# Altium integrated library Altium_WCAP-AI3H (rev22a).IntLib: 37 symbols
Pins are listed as number, name and electrical type; pins without a type are passive.

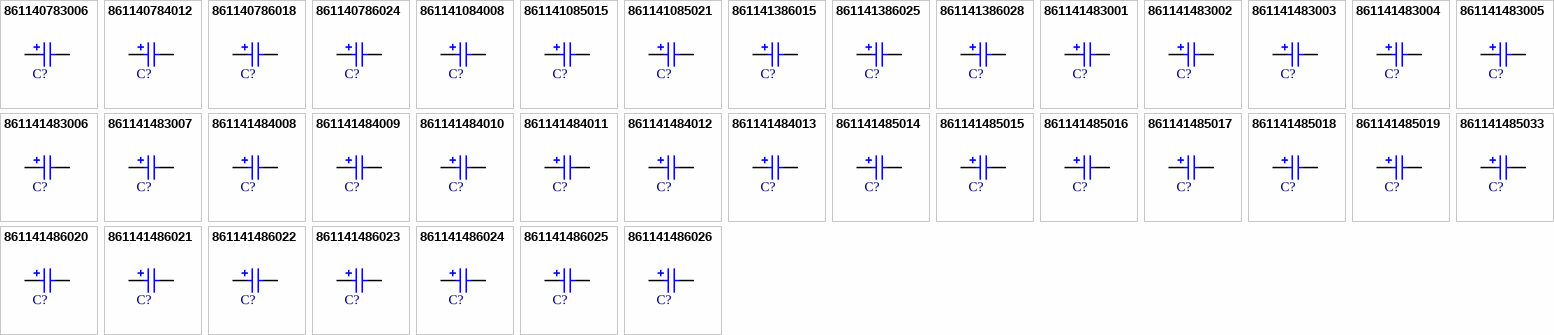
[diagram p0: symbols 861140783006 to 861141486026]

## 861140783006
designator C?, comment 2200uF  (value not drawn)
WCAP-AI3H Aluminum Electrolytic Capacitor, Snap-In, D22xH35mm, 2200uF, 63V; Manufacturer: Wurth Elektronik; Manufacturer Part Number: 861140783006; Capacitance Tolerance: +/-20%; Dissipation Factor: 20%; Endurance: 3000h; Leakage Current: 1116.87uA; Ripple Current: 1820mA; Technical Reference: ANDN350222M063DSIC3C000; ComponentLink1Description: Manufacturer Link; ComponentLink1URL: https://www.we-online.com/redexpert/article/861140783006?ad; ComponentLink2Description: Datasheet; ComponentLink2URL: https://www.we-online.com/redexpert/spec/861140783006?ad; Category: Aluminum Electrolytic Capacitors; Match Code: WCAP-AI3H; Mount: Through Hole; Operating Temperature Max: 105°C; Operating Temperature Min: -40°C; Packaging: Tray; Height: 35mm; Diameter: 22mm; Capacitance: 2200uF; Rated Voltage (DC): 63V
footprint WCAP-AI3H_D22H35
pins: 1 P, 2 N

## 861140784012
designator C?, comment 3300uF  (value not drawn)
WCAP-AI3H Aluminum Electrolytic Capacitor, Snap-In, D25xH35mm, 3300uF, 63V; Manufacturer: Wurth Elektronik; Manufacturer Part Number: 861140784012; Capacitance Tolerance: +/-20%; Dissipation Factor: 20%; Endurance: 3000h; Leakage Current: 1367.88uA; Ripple Current: 2270mA; Technical Reference: ANDO350332M063DSIC3C000; ComponentLink1Description: Manufacturer Link; ComponentLink1URL: https://www.we-online.com/redexpert/article/861140784012?ad; ComponentLink2Description: Datasheet; ComponentLink2URL: https://www.we-online.com/redexpert/spec/861140784012?ad; Category: Aluminum Electrolytic Capacitors; Match Code: WCAP-AI3H; Mount: Through Hole; Operating Temperature Max: 105°C; Operating Temperature Min: -40°C; Packaging: Tray; Height: 35mm; Diameter: 25mm; Capacitance: 3300uF; Rated Voltage (DC): 63V
footprint WCAP-AI3H_D25H35
pins: 1 P, 2 N

## 861140786018
designator C?, comment 4700uF  (value not drawn)
WCAP-AI3H Aluminum Electrolytic Capacitor, Snap-In, D35xH30mm, 4700uF, 63V; Manufacturer: Wurth Elektronik; Manufacturer Part Number: 861140786018; Capacitance Tolerance: +/-20%; Dissipation Factor: 30%; Endurance: 3000h; Leakage Current: 1632.45uA; Ripple Current: 2830mA; Technical Reference: ANDQ300472M063DSIC2C000; ComponentLink1Description: Manufacturer Link; ComponentLink1URL: https://www.we-online.com/redexpert/article/861140786018?ad; ComponentLink2Description: Datasheet; ComponentLink2URL: https://www.we-online.com/redexpert/spec/861140786018?ad; Category: Aluminum Electrolytic Capacitors; Match Code: WCAP-AI3H; Mount: Through Hole; Operating Temperature Max: 105°C; Operating Temperature Min: -40°C; Packaging: Tray; Height: 30mm; Diameter: 35mm; Capacitance: 4700uF; Rated Voltage (DC): 63V
footprint WCAP-AI3H_D35H30
pins: 1 P, 2 N

## 861140786024
designator C?, comment 10000uF  (value not drawn)
WCAP-AI3H Aluminum Electrolytic Capacitor, Snap-In, D35xH52mm, 10000uF, 63V; Manufacturer: Wurth Elektronik; Manufacturer Part Number: 861140786024; Capacitance Tolerance: +/-20%; Dissipation Factor: 30%; Endurance: 3000h; Leakage Current: 2381.18uA; Ripple Current: 4690mA; Technical Reference: ANDQ520103M063DSIC2C000; ComponentLink1Description: Manufacturer Link; ComponentLink1URL: https://www.we-online.com/redexpert/article/861140786024?ad; ComponentLink2Description: Datasheet; ComponentLink2URL: https://www.we-online.com/redexpert/spec/861140786024?ad; Category: Aluminum Electrolytic Capacitors; Match Code: WCAP-AI3H; Mount: Through Hole; Operating Temperature Max: 105°C; Operating Temperature Min: -40°C; Packaging: Tray; Height: 52mm; Diameter: 35mm; Capacitance: 10000uF; Rated Voltage (DC): 63V
footprint WCAP-AI3H_D35H52
pins: 1 P, 2 N

## 861141084008
designator C?, comment 470uF  (value not drawn)
WCAP-AI3H Aluminum Electrolytic Capacitor, Snap-In, D25xH30mm, 470uF, 200V; Manufacturer: Wurth Elektronik; Manufacturer Part Number: 861141084008; Capacitance Tolerance: +/-20%; Dissipation Factor: 15%; Endurance: 3000h; Leakage Current: 919.78uA; Ripple Current: 1500mA; Technical Reference: ANDO300471M200DSIC3C004; ComponentLink1Description: Manufacturer Link; ComponentLink1URL: https://www.we-online.com/redexpert/article/861141084008?ad; ComponentLink2Description: Datasheet; ComponentLink2URL: https://www.we-online.com/redexpert/spec/861141084008?ad; Category: Aluminum Electrolytic Capacitors; Match Code: WCAP-AI3H; Mount: Through Hole; Operating Temperature Max: 105°C; Operating Temperature Min: -25°C; Packaging: Tray; Height: 30mm; Diameter: 25mm; Capacitance: 470uF; Rated Voltage (DC): 200V
footprint WCAP-AI3H_D25H30
pins: 1 P, 2 N

## 861141085015
designator C?, comment 680uF  (value not drawn)
WCAP-AI3H Aluminum Electrolytic Capacitor, Snap-In, D30xH30mm, 680uF, 200V; Manufacturer: Wurth Elektronik; Manufacturer Part Number: 861141085015; Capacitance Tolerance: +/-20%; Dissipation Factor: 15%; Endurance: 3000h; Leakage Current: 1106.35uA; Ripple Current: 1780mA; Technical Reference: ANJP300681M200DSIC2C000; ComponentLink1Description: Manufacturer Link; ComponentLink1URL: https://www.we-online.com/redexpert/article/861141085015?ad; ComponentLink2Description: Datasheet; ComponentLink2URL: https://www.we-online.com/redexpert/spec/861141085015?ad; Category: Aluminum Electrolytic Capacitors; Match Code: WCAP-AI3H; Mount: Through Hole; Operating Temperature Max: 105°C; Operating Temperature Min: -25°C; Packaging: Tray; Height: 30mm; Diameter: 30mm; Capacitance: 680uF; Rated Voltage (DC): 200V
footprint WCAP-AI3H_D30H30
pins: 1 P, 2 N

## 861141085021
designator C?, comment 1000uF  (value not drawn)
WCAP-AI3H Aluminum Electrolytic Capacitor, Snap-In, D30xH35mm, 1000uF, 200V; Manufacturer: Wurth Elektronik; Manufacturer Part Number: 861141085021; Capacitance Tolerance: +/-20%; Dissipation Factor: 15%; Endurance: 3000h; Leakage Current: 1341.64uA; Ripple Current: 2300mA; Technical Reference: ANJP350102M200DSIC2C000; ComponentLink1Description: Manufacturer Link; ComponentLink1URL: https://www.we-online.com/redexpert/article/861141085021?ad; ComponentLink2Description: Datasheet; ComponentLink2URL: https://www.we-online.com/redexpert/spec/861141085021?ad; Category: Aluminum Electrolytic Capacitors; Match Code: WCAP-AI3H; Mount: Through Hole; Operating Temperature Max: 105°C; Operating Temperature Min: -25°C; Packaging: Tray; Height: 35mm; Diameter: 30mm; Capacitance: 1000uF; Rated Voltage (DC): 200V
footprint WCAP-AI3H_D30H35
pins: 1 P, 2 N

## 861141386015
designator C?, comment 220uF  (value not drawn)
WCAP-AI3H Aluminum Electrolytic Capacitor, Snap-In, D35xH25mm, 220uF, 400V; Manufacturer: Wurth Elektronik; Manufacturer Part Number: 861141386015; Capacitance Tolerance: +/-20%; Dissipation Factor: 20%; Endurance: 3000h; Leakage Current: 889.94uA; Ripple Current: 1100mA; Technical Reference: ANJQ250221M400DSIC2C000; ComponentLink1Description: Manufacturer Link; ComponentLink1URL: https://www.we-online.com/redexpert/article/861141386015?ad; ComponentLink2Description: Datasheet; ComponentLink2URL: https://www.we-online.com/redexpert/spec/861141386015?ad; Category: Aluminum Electrolytic Capacitors; Match Code: WCAP-AI3H; Mount: Through Hole; Operating Temperature Max: 105°C; Operating Temperature Min: -25°C; Packaging: Tray; Height: 25mm; Diameter: 35mm; Capacitance: 220uF; Rated Voltage (DC): 400V
footprint WCAP-AI3H_D35H25
pins: 1 P, 2 N

## 861141386025
designator C?, comment 470uF  (value not drawn)
WCAP-AI3H Aluminum Electrolytic Capacitor, Snap-In, D35xH40mm, 470uF, 400V; Manufacturer: Wurth Elektronik; Manufacturer Part Number: 861141386025; Capacitance Tolerance: +/-20%; Dissipation Factor: 20%; Endurance: 3000h; Leakage Current: 1300.77uA; Ripple Current: 1900mA; Technical Reference: ANJQ400471M400DSIC2C000; ComponentLink1Description: Manufacturer Link; ComponentLink1URL: https://www.we-online.com/redexpert/article/861141386025?ad; ComponentLink2Description: Datasheet; ComponentLink2URL: https://www.we-online.com/redexpert/spec/861141386025?ad; Category: Aluminum Electrolytic Capacitors; Match Code: WCAP-AI3H; Mount: Through Hole; Operating Temperature Max: 105°C; Operating Temperature Min: -25°C; Packaging: Tray; Height: 40mm; Diameter: 35mm; Capacitance: 470uF; Rated Voltage (DC): 400V
footprint WCAP-AI3H_D35H40
pins: 1 P, 2 N

## 861141386028
designator C?, comment 1000uF  (value not drawn)
WCAP-AI3H Aluminum Electrolytic Capacitor, Snap-In, D35xH65mm, 1000uF, 400V; Manufacturer: Wurth Elektronik; Manufacturer Part Number: 861141386028; Capacitance Tolerance: +/-20%; Dissipation Factor: 20%; Endurance: 3000h; Leakage Current: 1897.37uA; Ripple Current: 2650mA; Technical Reference: ANJQ650102M400DSIC2C000; ComponentLink1Description: Manufacturer Link; ComponentLink1URL: https://www.we-online.com/redexpert/article/861141386028?ad; ComponentLink2Description: Datasheet; ComponentLink2URL: https://www.we-online.com/redexpert/spec/861141386028?ad; Category: Aluminum Electrolytic Capacitors; Match Code: WCAP-AI3H; Mount: Through Hole; Operating Temperature Max: 105°C; Operating Temperature Min: -25°C; Packaging: Tray; Height: 65mm; Diameter: 35mm; Capacitance: 1000uF; Rated Voltage (DC): 400V
footprint WCAP-AI3H_D35H65
pins: 1 P, 2 N

## 861141483001
designator C?, comment 68uF  (value not drawn)
WCAP-AI3H Aluminum Electrolytic Capacitor, Snap-In, D22xH25mm, 68uF, 450V; Manufacturer: Wurth Elektronik; Manufacturer Part Number: 861141483001; Capacitance Tolerance: +/-20%; Dissipation Factor: 20%; Endurance: 3000h; Leakage Current: 524.79uA; Ripple Current: 520mA; Technical Reference: ANJN250680M450DSIC3C000; ComponentLink1Description: Manufacturer Link; ComponentLink1URL: https://www.we-online.com/redexpert/article/861141483001?ad; ComponentLink2Description: Datasheet; ComponentLink2URL: https://www.we-online.com/redexpert/spec/861141483001?ad; Category: Aluminum Electrolytic Capacitors; Match Code: WCAP-AI3H; Mount: Through Hole; Operating Temperature Max: 105°C; Operating Temperature Min: -25°C; Packaging: Tray; Height: 25mm; Diameter: 22mm; Capacitance: 68uF; Rated Voltage (DC): 450V
footprint WCAP-AI3H_D22H25
pins: 1 P, 2 N

## 861141483002
designator C?, comment 82uF  (value not drawn)
WCAP-AI3H Aluminum Electrolytic Capacitor, Snap-In, D22xH30mm, 82uF, 450V; Manufacturer: Wurth Elektronik; Manufacturer Part Number: 861141483002; Capacitance Tolerance: +/-20%; Dissipation Factor: 20%; Endurance: 3000h; Leakage Current: 576.28uA; Ripple Current: 640mA; Technical Reference: ANJN300820M450DSIC3C000; ComponentLink1Description: Manufacturer Link; ComponentLink1URL: https://www.we-online.com/redexpert/article/861141483002?ad; ComponentLink2Description: Datasheet; ComponentLink2URL: https://www.we-online.com/redexpert/spec/861141483002?ad; Category: Aluminum Electrolytic Capacitors; Match Code: WCAP-AI3H; Mount: Through Hole; Operating Temperature Max: 105°C; Operating Temperature Min: -25°C; Packaging: Tray; Height: 30mm; Diameter: 22mm; Capacitance: 82uF; Rated Voltage (DC): 450V
footprint WCAP-AI3H_D22H30
pins: 1 P, 2 N

## 861141483003
designator C?, comment 100uF  (value not drawn)
WCAP-AI3H Aluminum Electrolytic Capacitor, Snap-In, D22xH35mm, 100uF, 450V; Manufacturer: Wurth Elektronik; Manufacturer Part Number: 861141483003; Capacitance Tolerance: +/-20%; Dissipation Factor: 20%; Endurance: 3000h; Leakage Current: 636.4uA; Ripple Current: 690mA; Technical Reference: ANJN350101M450DSIC3C000; ComponentLink1Description: Manufacturer Link; ComponentLink1URL: https://www.we-online.com/redexpert/article/861141483003?ad; ComponentLink2Description: Datasheet; ComponentLink2URL: https://www.we-online.com/redexpert/spec/861141483003?ad; Category: Aluminum Electrolytic Capacitors; Match Code: WCAP-AI3H; Mount: Through Hole; Operating Temperature Max: 105°C; Operating Temperature Min: -25°C; Packaging: Tray; Height: 35mm; Diameter: 22mm; Capacitance: 100uF; Rated Voltage (DC): 450V
footprint WCAP-AI3H_D22H35
pins: 1 P, 2 N

## 861141483004
designator C?, comment 120uF  (value not drawn)
WCAP-AI3H Aluminum Electrolytic Capacitor, Snap-In, D22xH40mm, 120uF, 450V; Manufacturer: Wurth Elektronik; Manufacturer Part Number: 861141483004; Capacitance Tolerance: +/-20%; Dissipation Factor: 20%; Endurance: 3000h; Leakage Current: 697.14uA; Ripple Current: 800mA; Technical Reference: ANJN400121M450DSIC3C000; ComponentLink1Description: Manufacturer Link; ComponentLink1URL: https://www.we-online.com/redexpert/article/861141483004?ad; ComponentLink2Description: Datasheet; ComponentLink2URL: https://www.we-online.com/redexpert/spec/861141483004?ad; Category: Aluminum Electrolytic Capacitors; Match Code: WCAP-AI3H; Mount: Through Hole; Operating Temperature Max: 105°C; Operating Temperature Min: -25°C; Packaging: Tray; Height: 40mm; Diameter: 22mm; Capacitance: 120uF; Rated Voltage (DC): 450V
footprint WCAP-AI3H_D22H40
pins: 1 P, 2 N

## 861141483005
designator C?, comment 150uF  (value not drawn)
WCAP-AI3H Aluminum Electrolytic Capacitor, Snap-In, D22xH45mm, 150uF, 450V; Manufacturer: Wurth Elektronik; Manufacturer Part Number: 861141483005; Capacitance Tolerance: +/-20%; Dissipation Factor: 20%; Endurance: 3000h; Leakage Current: 779.42uA; Ripple Current: 880mA; Technical Reference: ANJN450151M450DSIC3C000; ComponentLink1Description: Manufacturer Link; ComponentLink1URL: https://www.we-online.com/redexpert/article/861141483005?ad; ComponentLink2Description: Datasheet; ComponentLink2URL: https://www.we-online.com/redexpert/spec/861141483005?ad; Category: Aluminum Electrolytic Capacitors; Match Code: WCAP-AI3H; Mount: Through Hole; Operating Temperature Max: 105°C; Operating Temperature Min: -25°C; Packaging: Tray; Height: 45mm; Diameter: 22mm; Capacitance: 150uF; Rated Voltage (DC): 450V
footprint WCAP-AI3H_D22H45
pins: 1 P, 2 N

## 861141483006
designator C?, comment 180uF  (value not drawn)
WCAP-AI3H Aluminum Electrolytic Capacitor, Snap-In, D22xH50mm, 180uF, 450V; Manufacturer: Wurth Elektronik; Manufacturer Part Number: 861141483006; Capacitance Tolerance: +/-20%; Dissipation Factor: 20%; Endurance: 3000h; Leakage Current: 853.81uA; Ripple Current: 1000mA; Technical Reference: ANJN500181M450DSIC3C000; ComponentLink1Description: Manufacturer Link; ComponentLink1URL: https://www.we-online.com/redexpert/article/861141483006?ad; ComponentLink2Description: Datasheet; ComponentLink2URL: https://www.we-online.com/redexpert/spec/861141483006?ad; Category: Aluminum Electrolytic Capacitors; Match Code: WCAP-AI3H; Mount: Through Hole; Operating Temperature Max: 105°C; Operating Temperature Min: -25°C; Packaging: Tray; Height: 50mm; Diameter: 22mm; Capacitance: 180uF; Rated Voltage (DC): 450V
footprint WCAP-AI3H_D22H50
pins: 1 P, 2 N

## 861141483007
designator C?, comment 220uF  (value not drawn)
WCAP-AI3H Aluminum Electrolytic Capacitor, Snap-In, D22xH50mm, 220uF, 450V; Manufacturer: Wurth Elektronik; Manufacturer Part Number: 861141483007; Capacitance Tolerance: +/-20%; Dissipation Factor: 20%; Endurance: 3000h; Leakage Current: 943.93uA; Ripple Current: 1000mA; Technical Reference: ANJN500221M450DSIC3C000; ComponentLink1Description: Manufacturer Link; ComponentLink1URL: https://www.we-online.com/redexpert/article/861141483007?ad; ComponentLink2Description: Datasheet; ComponentLink2URL: https://www.we-online.com/redexpert/spec/861141483007?ad; Category: Aluminum Electrolytic Capacitors; Match Code: WCAP-AI3H; Mount: Through Hole; Operating Temperature Max: 105°C; Operating Temperature Min: -25°C; Packaging: Tray; Height: 50mm; Diameter: 22mm; Capacitance: 220uF; Rated Voltage (DC): 450V
footprint WCAP-AI3H_D22H50
pins: 1 P, 2 N

## 861141484008
designator C?, comment 82uF  (value not drawn)
WCAP-AI3H Aluminum Electrolytic Capacitor, Snap-In, D25xH25mm, 82uF, 450V; Manufacturer: Wurth Elektronik; Manufacturer Part Number: 861141484008; Capacitance Tolerance: +/-20%; Dissipation Factor: 20%; Endurance: 3000h; Leakage Current: 576.28uA; Ripple Current: 640mA; Technical Reference: ANJO250820M450DSIC3C000; ComponentLink1Description: Manufacturer Link; ComponentLink1URL: https://www.we-online.com/redexpert/article/861141484008?ad; ComponentLink2Description: Datasheet; ComponentLink2URL: https://www.we-online.com/redexpert/spec/861141484008?ad; Category: Aluminum Electrolytic Capacitors; Match Code: WCAP-AI3H; Mount: Through Hole; Operating Temperature Max: 105°C; Operating Temperature Min: -25°C; Packaging: Tray; Height: 25mm; Diameter: 25mm; Capacitance: 82uF; Rated Voltage (DC): 450V
footprint WCAP-AI3H_D25H25
pins: 1 P, 2 N

## 861141484009
designator C?, comment 100uF  (value not drawn)
WCAP-AI3H Aluminum Electrolytic Capacitor, Snap-In, D25xH30mm, 100uF, 450V; Manufacturer: Wurth Elektronik; Manufacturer Part Number: 861141484009; Capacitance Tolerance: +/-20%; Dissipation Factor: 20%; Endurance: 3000h; Leakage Current: 636.4uA; Ripple Current: 690mA; Technical Reference: ANJO300101M450DSIC3C000; ComponentLink1Description: Manufacturer Link; ComponentLink1URL: https://www.we-online.com/redexpert/article/861141484009?ad; ComponentLink2Description: Datasheet; ComponentLink2URL: https://www.we-online.com/redexpert/spec/861141484009?ad; Category: Aluminum Electrolytic Capacitors; Match Code: WCAP-AI3H; Mount: Through Hole; Operating Temperature Max: 105°C; Operating Temperature Min: -25°C; Packaging: Tray; Height: 30mm; Diameter: 25mm; Capacitance: 100uF; Rated Voltage (DC): 450V
footprint WCAP-AI3H_D25H30
pins: 1 P, 2 N

## 861141484010
designator C?, comment 120uF  (value not drawn)
WCAP-AI3H Aluminum Electrolytic Capacitor, Snap-In, D25xH30mm, 120uF, 450V; Manufacturer: Wurth Elektronik; Manufacturer Part Number: 861141484010; Capacitance Tolerance: +/-20%; Dissipation Factor: 20%; Endurance: 3000h; Leakage Current: 697.14uA; Ripple Current: 800mA; Technical Reference: ANJO300121M450DSIC3C000; ComponentLink1Description: Manufacturer Link; ComponentLink1URL: https://www.we-online.com/redexpert/article/861141484010?ad; ComponentLink2Description: Datasheet; ComponentLink2URL: https://www.we-online.com/redexpert/spec/861141484010?ad; Category: Aluminum Electrolytic Capacitors; Match Code: WCAP-AI3H; Mount: Through Hole; Operating Temperature Max: 105°C; Operating Temperature Min: -25°C; Packaging: Tray; Height: 30mm; Diameter: 25mm; Capacitance: 120uF; Rated Voltage (DC): 450V
footprint WCAP-AI3H_D25H30
pins: 1 P, 2 N

## 861141484011
designator C?, comment 150uF  (value not drawn)
WCAP-AI3H Aluminum Electrolytic Capacitor, Snap-In, D25xH35mm, 150uF, 450V; Manufacturer: Wurth Elektronik; Manufacturer Part Number: 861141484011; Capacitance Tolerance: +/-20%; Dissipation Factor: 20%; Endurance: 3000h; Leakage Current: 779.42uA; Ripple Current: 880mA; Technical Reference: ANJO350151M450DSIC3C000; ComponentLink1Description: Manufacturer Link; ComponentLink1URL: https://www.we-online.com/redexpert/article/861141484011?ad; ComponentLink2Description: Datasheet; ComponentLink2URL: https://www.we-online.com/redexpert/spec/861141484011?ad; Category: Aluminum Electrolytic Capacitors; Match Code: WCAP-AI3H; Mount: Through Hole; Operating Temperature Max: 105°C; Operating Temperature Min: -25°C; Packaging: Tray; Height: 35mm; Diameter: 25mm; Capacitance: 150uF; Rated Voltage (DC): 450V
footprint WCAP-AI3H_D25H35
pins: 1 P, 2 N

## 861141484012
designator C?, comment 180uF  (value not drawn)
WCAP-AI3H Aluminum Electrolytic Capacitor, Snap-In, D25xH40mm, 180uF, 450V; Manufacturer: Wurth Elektronik; Manufacturer Part Number: 861141484012; Capacitance Tolerance: +/-20%; Dissipation Factor: 20%; Endurance: 3000h; Leakage Current: 853.81uA; Ripple Current: 1000mA; Technical Reference: ANJO400181M450DSIC3C000; ComponentLink1Description: Manufacturer Link; ComponentLink1URL: https://www.we-online.com/redexpert/article/861141484012?ad; ComponentLink2Description: Datasheet; ComponentLink2URL: https://www.we-online.com/redexpert/spec/861141484012?ad; Category: Aluminum Electrolytic Capacitors; Match Code: WCAP-AI3H; Mount: Through Hole; Operating Temperature Max: 105°C; Operating Temperature Min: -25°C; Packaging: Tray; Height: 40mm; Diameter: 25mm; Capacitance: 180uF; Rated Voltage (DC): 450V
footprint WCAP-AI3H_D25H40
pins: 1 P, 2 N

## 861141484013
designator C?, comment 220uF  (value not drawn)
WCAP-AI3H Aluminum Electrolytic Capacitor, Snap-In, D25xH45mm, 220uF, 450V; Manufacturer: Wurth Elektronik; Manufacturer Part Number: 861141484013; Capacitance Tolerance: +/-20%; Dissipation Factor: 20%; Endurance: 3000h; Leakage Current: 943.93uA; Ripple Current: 1120mA; Technical Reference: ANJO450221M450DSIC3C000; ComponentLink1Description: Manufacturer Link; ComponentLink1URL: https://www.we-online.com/redexpert/article/861141484013?ad; ComponentLink2Description: Datasheet; ComponentLink2URL: https://www.we-online.com/redexpert/spec/861141484013?ad; Category: Aluminum Electrolytic Capacitors; Match Code: WCAP-AI3H; Mount: Through Hole; Operating Temperature Max: 105°C; Operating Temperature Min: -25°C; Packaging: Tray; Height: 45mm; Diameter: 25mm; Capacitance: 220uF; Rated Voltage (DC): 450V
footprint WCAP-AI3H_D25H45
pins: 1 P, 2 N

## 861141485014
designator C?, comment 120uF  (value not drawn)
WCAP-AI3H Aluminum Electrolytic Capacitor, Snap-In, D30xH25mm, 120uF, 450V; Manufacturer: Wurth Elektronik; Manufacturer Part Number: 861141485014; Capacitance Tolerance: +/-20%; Dissipation Factor: 20%; Endurance: 3000h; Leakage Current: 697.14uA; Ripple Current: 800mA; Technical Reference: ANJP250121M450DSIC2C000; ComponentLink1Description: Manufacturer Link; ComponentLink1URL: https://www.we-online.com/redexpert/article/861141485014?ad; ComponentLink2Description: Datasheet; ComponentLink2URL: https://www.we-online.com/redexpert/spec/861141485014?ad; Category: Aluminum Electrolytic Capacitors; Match Code: WCAP-AI3H; Mount: Through Hole; Operating Temperature Max: 105°C; Operating Temperature Min: -25°C; Packaging: Tray; Height: 25mm; Diameter: 30mm; Capacitance: 120uF; Rated Voltage (DC): 450V
footprint WCAP-AI3H_D30H25
pins: 1 P, 2 N

## 861141485015
designator C?, comment 150uF  (value not drawn)
WCAP-AI3H Aluminum Electrolytic Capacitor, Snap-In, D30xH30mm, 150uF, 450V; Manufacturer: Wurth Elektronik; Manufacturer Part Number: 861141485015; Capacitance Tolerance: +/-20%; Dissipation Factor: 20%; Endurance: 3000h; Leakage Current: 779.42uA; Ripple Current: 880mA; Technical Reference: ANJP300151M450DSIC2C000; ComponentLink1Description: Manufacturer Link; ComponentLink1URL: https://www.we-online.com/redexpert/article/861141485015?ad; ComponentLink2Description: Datasheet; ComponentLink2URL: https://www.we-online.com/redexpert/spec/861141485015?ad; Category: Aluminum Electrolytic Capacitors; Match Code: WCAP-AI3H; Mount: Through Hole; Operating Temperature Max: 105°C; Operating Temperature Min: -25°C; Packaging: Tray; Height: 30mm; Diameter: 30mm; Capacitance: 150uF; Rated Voltage (DC): 450V
footprint WCAP-AI3H_D30H30
pins: 1 P, 2 N

## 861141485016
designator C?, comment 180uF  (value not drawn)
WCAP-AI3H Aluminum Electrolytic Capacitor, Snap-In, D30xH30mm, 180uF, 450V; Manufacturer: Wurth Elektronik; Manufacturer Part Number: 861141485016; Capacitance Tolerance: +/-20%; Dissipation Factor: 20%; Endurance: 3000h; Leakage Current: 853.81uA; Ripple Current: 1000mA; Technical Reference: ANJP300181M450DSIC2C000; ComponentLink1Description: Manufacturer Link; ComponentLink1URL: https://www.we-online.com/redexpert/article/861141485016?ad; ComponentLink2Description: Datasheet; ComponentLink2URL: https://www.we-online.com/redexpert/spec/861141485016?ad; Category: Aluminum Electrolytic Capacitors; Match Code: WCAP-AI3H; Mount: Through Hole; Operating Temperature Max: 105°C; Operating Temperature Min: -25°C; Packaging: Tray; Height: 30mm; Diameter: 30mm; Capacitance: 180uF; Rated Voltage (DC): 450V
footprint WCAP-AI3H_D30H30
pins: 1 P, 2 N

## 861141485017
designator C?, comment 220uF  (value not drawn)
WCAP-AI3H Aluminum Electrolytic Capacitor, Snap-In, D30xH35mm, 220uF, 450V; Manufacturer: Wurth Elektronik; Manufacturer Part Number: 861141485017; Capacitance Tolerance: +/-20%; Dissipation Factor: 20%; Endurance: 3000h; Leakage Current: 943.93uA; Ripple Current: 1120mA; Technical Reference: ANJP350221M450DSIC2C000; ComponentLink1Description: Manufacturer Link; ComponentLink1URL: https://www.we-online.com/redexpert/article/861141485017?ad; ComponentLink2Description: Datasheet; ComponentLink2URL: https://www.we-online.com/redexpert/spec/861141485017?ad; Category: Aluminum Electrolytic Capacitors; Match Code: WCAP-AI3H; Mount: Through Hole; Operating Temperature Max: 105°C; Operating Temperature Min: -25°C; Packaging: Tray; Height: 35mm; Diameter: 30mm; Capacitance: 220uF; Rated Voltage (DC): 450V
footprint WCAP-AI3H_D30H35
pins: 1 P, 2 N

## 861141485018
designator C?, comment 270uF  (value not drawn)
WCAP-AI3H Aluminum Electrolytic Capacitor, Snap-In, D30xH40mm, 270uF, 450V; Manufacturer: Wurth Elektronik; Manufacturer Part Number: 861141485018; Capacitance Tolerance: +/-20%; Dissipation Factor: 20%; Endurance: 3000h; Leakage Current: 1045.71uA; Ripple Current: 1280mA; Technical Reference: ANJP400271M450DSIC2C000; ComponentLink1Description: Manufacturer Link; ComponentLink1URL: https://www.we-online.com/redexpert/article/861141485018?ad; ComponentLink2Description: Datasheet; ComponentLink2URL: https://www.we-online.com/redexpert/spec/861141485018?ad; Category: Aluminum Electrolytic Capacitors; Match Code: WCAP-AI3H; Mount: Through Hole; Operating Temperature Max: 105°C; Operating Temperature Min: -25°C; Packaging: Tray; Height: 40mm; Diameter: 30mm; Capacitance: 270uF; Rated Voltage (DC): 450V
footprint WCAP-AI3H_D30H40
pins: 1 P, 2 N

## 861141485019
designator C?, comment 330uF  (value not drawn)
WCAP-AI3H Aluminum Electrolytic Capacitor, Snap-In, D30xH50mm, 330uF, 450V; Manufacturer: Wurth Elektronik; Manufacturer Part Number: 861141485019; Capacitance Tolerance: +/-20%; Dissipation Factor: 20%; Endurance: 3000h; Leakage Current: 1156.07uA; Ripple Current: 1450mA; Technical Reference: ANJP500331M450DSIC2C000; ComponentLink1Description: Manufacturer Link; ComponentLink1URL: https://www.we-online.com/redexpert/article/861141485019?ad; ComponentLink2Description: Datasheet; ComponentLink2URL: https://www.we-online.com/redexpert/spec/861141485019?ad; Category: Aluminum Electrolytic Capacitors; Match Code: WCAP-AI3H; Mount: Through Hole; Operating Temperature Max: 105°C; Operating Temperature Min: -25°C; Packaging: Tray; Height: 50mm; Diameter: 30mm; Capacitance: 330uF; Rated Voltage (DC): 450V
footprint WCAP-AI3H_D30H50
pins: 1 P, 2 N

## 861141485033
designator C?, comment 470uF  (value not drawn)
WCAP-AI3H Aluminum Electrolytic Capacitor, Snap-In, D30xH40mm, 470uF, 450V; Manufacturer: Wurth Elektronik; Manufacturer Part Number: 861141485033; Capacitance Tolerance: +/-20%; Dissipation Factor: 20%; Endurance: 4000h; Leakage Current: 1380uA; Ripple Current: 1940mA; Technical Reference: ANDP400471M450DSIC2D0T2; ComponentLink1Description: Manufacturer Link; ComponentLink1URL: https://www.we-online.com/redexpert/article/861141485033?ad; ComponentLink2Description: Datasheet; ComponentLink2URL: https://www.we-online.com/redexpert/spec/861141485033?ad; Category: Aluminum Electrolytic Capacitors; Match Code: WCAP-AI3H; Mount: Through Hole; Operating Temperature Max: 105°C; Operating Temperature Min: -40°C; Packaging: Tray; Height: 40mm; Diameter: 30mm; Capacitance: 470uF; Rated Voltage (DC): 450V
footprint WCAP-AI3H_D30H40
pins: 1 P, 2 N

## 861141486020
designator C?, comment 220uF  (value not drawn)
WCAP-AI3H Aluminum Electrolytic Capacitor, Snap-In, D35xH30mm, 220uF, 450V; Manufacturer: Wurth Elektronik; Manufacturer Part Number: 861141486020; Capacitance Tolerance: +/-20%; Dissipation Factor: 20%; Endurance: 3000h; Leakage Current: 943.93uA; Ripple Current: 1120mA; Technical Reference: ANJQ300221M450DSIC2C000; ComponentLink1Description: Manufacturer Link; ComponentLink1URL: https://www.we-online.com/redexpert/article/861141486020?ad; ComponentLink2Description: Datasheet; ComponentLink2URL: https://www.we-online.com/redexpert/spec/861141486020?ad; Category: Aluminum Electrolytic Capacitors; Match Code: WCAP-AI3H; Mount: Through Hole; Operating Temperature Max: 105°C; Operating Temperature Min: -25°C; Packaging: Tray; Height: 30mm; Diameter: 35mm; Capacitance: 220uF; Rated Voltage (DC): 450V
footprint WCAP-AI3H_D35H30
pins: 1 P, 2 N

## 861141486021
designator C?, comment 270uF  (value not drawn)
WCAP-AI3H Aluminum Electrolytic Capacitor, Snap-In, D35xH35mm, 270uF, 450V; Manufacturer: Wurth Elektronik; Manufacturer Part Number: 861141486021; Capacitance Tolerance: +/-20%; Dissipation Factor: 20%; Endurance: 3000h; Leakage Current: 1045.71uA; Ripple Current: 1280mA; Technical Reference: ANJQ350271M450DSIC2C000; ComponentLink1Description: Manufacturer Link; ComponentLink1URL: https://www.we-online.com/redexpert/article/861141486021?ad; ComponentLink2Description: Datasheet; ComponentLink2URL: https://www.we-online.com/redexpert/spec/861141486021?ad; Category: Aluminum Electrolytic Capacitors; Match Code: WCAP-AI3H; Mount: Through Hole; Operating Temperature Max: 105°C; Operating Temperature Min: -25°C; Packaging: Tray; Height: 35mm; Diameter: 35mm; Capacitance: 270uF; Rated Voltage (DC): 450V
footprint WCAP-AI3H_D35H35
pins: 1 P, 2 N

## 861141486022
designator C?, comment 330uF  (value not drawn)
WCAP-AI3H Aluminum Electrolytic Capacitor, Snap-In, D35xH42mm, 330uF, 450V; Manufacturer: Wurth Elektronik; Manufacturer Part Number: 861141486022; Capacitance Tolerance: +/-20%; Dissipation Factor: 20%; Endurance: 3000h; Leakage Current: 1156.07uA; Ripple Current: 1450mA; Technical Reference: ANJQ420331M450DSIC2C000; ComponentLink1Description: Manufacturer Link; ComponentLink1URL: https://www.we-online.com/redexpert/article/861141486022?ad; ComponentLink2Description: Datasheet; ComponentLink2URL: https://www.we-online.com/redexpert/spec/861141486022?ad; Category: Aluminum Electrolytic Capacitors; Match Code: WCAP-AI3H; Mount: Through Hole; Operating Temperature Max: 105°C; Operating Temperature Min: -25°C; Packaging: Tray; Height: 42mm; Diameter: 35mm; Capacitance: 330uF; Rated Voltage (DC): 450V
footprint WCAP-AI3H_D35H42
pins: 1 P, 2 N

## 861141486023
designator C?, comment 390uF  (value not drawn)
WCAP-AI3H Aluminum Electrolytic Capacitor, Snap-In, D35xH40mm, 390uF, 450V; Manufacturer: Wurth Elektronik; Manufacturer Part Number: 861141486023; Capacitance Tolerance: +/-20%; Dissipation Factor: 20%; Endurance: 3000h; Leakage Current: 1256.78uA; Ripple Current: 1500mA; Technical Reference: ANJQ400391M450DSIC2C000; ComponentLink1Description: Manufacturer Link; ComponentLink1URL: https://www.we-online.com/redexpert/article/861141486023?ad; ComponentLink2Description: Datasheet; ComponentLink2URL: https://www.we-online.com/redexpert/spec/861141486023?ad; Category: Aluminum Electrolytic Capacitors; Match Code: WCAP-AI3H; Mount: Through Hole; Operating Temperature Max: 105°C; Operating Temperature Min: -25°C; Packaging: Tray; Height: 40mm; Diameter: 35mm; Capacitance: 390uF; Rated Voltage (DC): 450V
footprint WCAP-AI3H_D35H40
pins: 1 P, 2 N

## 861141486024
designator C?, comment 470uF  (value not drawn)
WCAP-AI3H Aluminum Electrolytic Capacitor, Snap-In, D35xH50mm, 470uF, 450V; Manufacturer: Wurth Elektronik; Manufacturer Part Number: 861141486024; Capacitance Tolerance: +/-20%; Dissipation Factor: 20%; Endurance: 3000h; Leakage Current: 1379.67uA; Ripple Current: 1850mA; Technical Reference: ANJQ500471M450DSIC2C000; ComponentLink1Description: Manufacturer Link; ComponentLink1URL: https://www.we-online.com/redexpert/article/861141486024?ad; ComponentLink2Description: Datasheet; ComponentLink2URL: https://www.we-online.com/redexpert/spec/861141486024?ad; Category: Aluminum Electrolytic Capacitors; Match Code: WCAP-AI3H; Mount: Through Hole; Operating Temperature Max: 105°C; Operating Temperature Min: -25°C; Packaging: Tray; Height: 50mm; Diameter: 35mm; Capacitance: 470uF; Rated Voltage (DC): 450V
footprint WCAP-AI3H_D35H50
pins: 1 P, 2 N

## 861141486025
designator C?, comment 560uF  (value not drawn)
WCAP-AI3H Aluminum Electrolytic Capacitor, Snap-In, D35xH55mm, 560uF, 450V; Manufacturer: Wurth Elektronik; Manufacturer Part Number: 861141486025; Capacitance Tolerance: +/-20%; Dissipation Factor: 20%; Endurance: 3000h; Leakage Current: 1505.99uA; Ripple Current: 2150mA; Technical Reference: ANJQ550561M450DSIC2C000; ComponentLink1Description: Manufacturer Link; ComponentLink1URL: https://www.we-online.com/redexpert/article/861141486025?ad; ComponentLink2Description: Datasheet; ComponentLink2URL: https://www.we-online.com/redexpert/spec/861141486025?ad; Category: Aluminum Electrolytic Capacitors; Match Code: WCAP-AI3H; Mount: Through Hole; Operating Temperature Max: 105°C; Operating Temperature Min: -25°C; Packaging: Tray; Height: 55mm; Diameter: 35mm; Capacitance: 560uF; Rated Voltage (DC): 450V
footprint WCAP-AI3H_D35H55
pins: 1 P, 2 N

## 861141486026
designator C?, comment 680uF  (value not drawn)
WCAP-AI3H Aluminum Electrolytic Capacitor, Snap-In, D35xH55mm, 680uF, 450V; Manufacturer: Wurth Elektronik; Manufacturer Part Number: 861141486026; Capacitance Tolerance: +/-20%; Dissipation Factor: 20%; Endurance: 3000h; Leakage Current: 1659.52uA; Ripple Current: 2200mA; Technical Reference: ANJQ550681M450DSIC2C000; ComponentLink1Description: Manufacturer Link; ComponentLink1URL: https://www.we-online.com/redexpert/article/861141486026?ad; ComponentLink2Description: Datasheet; ComponentLink2URL: https://www.we-online.com/redexpert/spec/861141486026?ad; Category: Aluminum Electrolytic Capacitors; Match Code: WCAP-AI3H; Mount: Through Hole; Operating Temperature Max: 105°C; Operating Temperature Min: -25°C; Packaging: Tray; Height: 55mm; Diameter: 35mm; Capacitance: 680uF; Rated Voltage (DC): 450V
footprint WCAP-AI3H_D35H55
pins: 1 P, 2 N